# Altium footprint library Vowstar_Basic_Device.PcbLib: 170 footprints (part 9 of 11)
Each footprint in its own frame and in the unit in brackets; x right, y up, seen from the top. Pads: shape width x height; smd on the part's side, far side on the other; paste and mask are expansions set on the pad; w line width, h text height; cw(c..) or ccw(c..) is an arc to the next point about the centre after c.
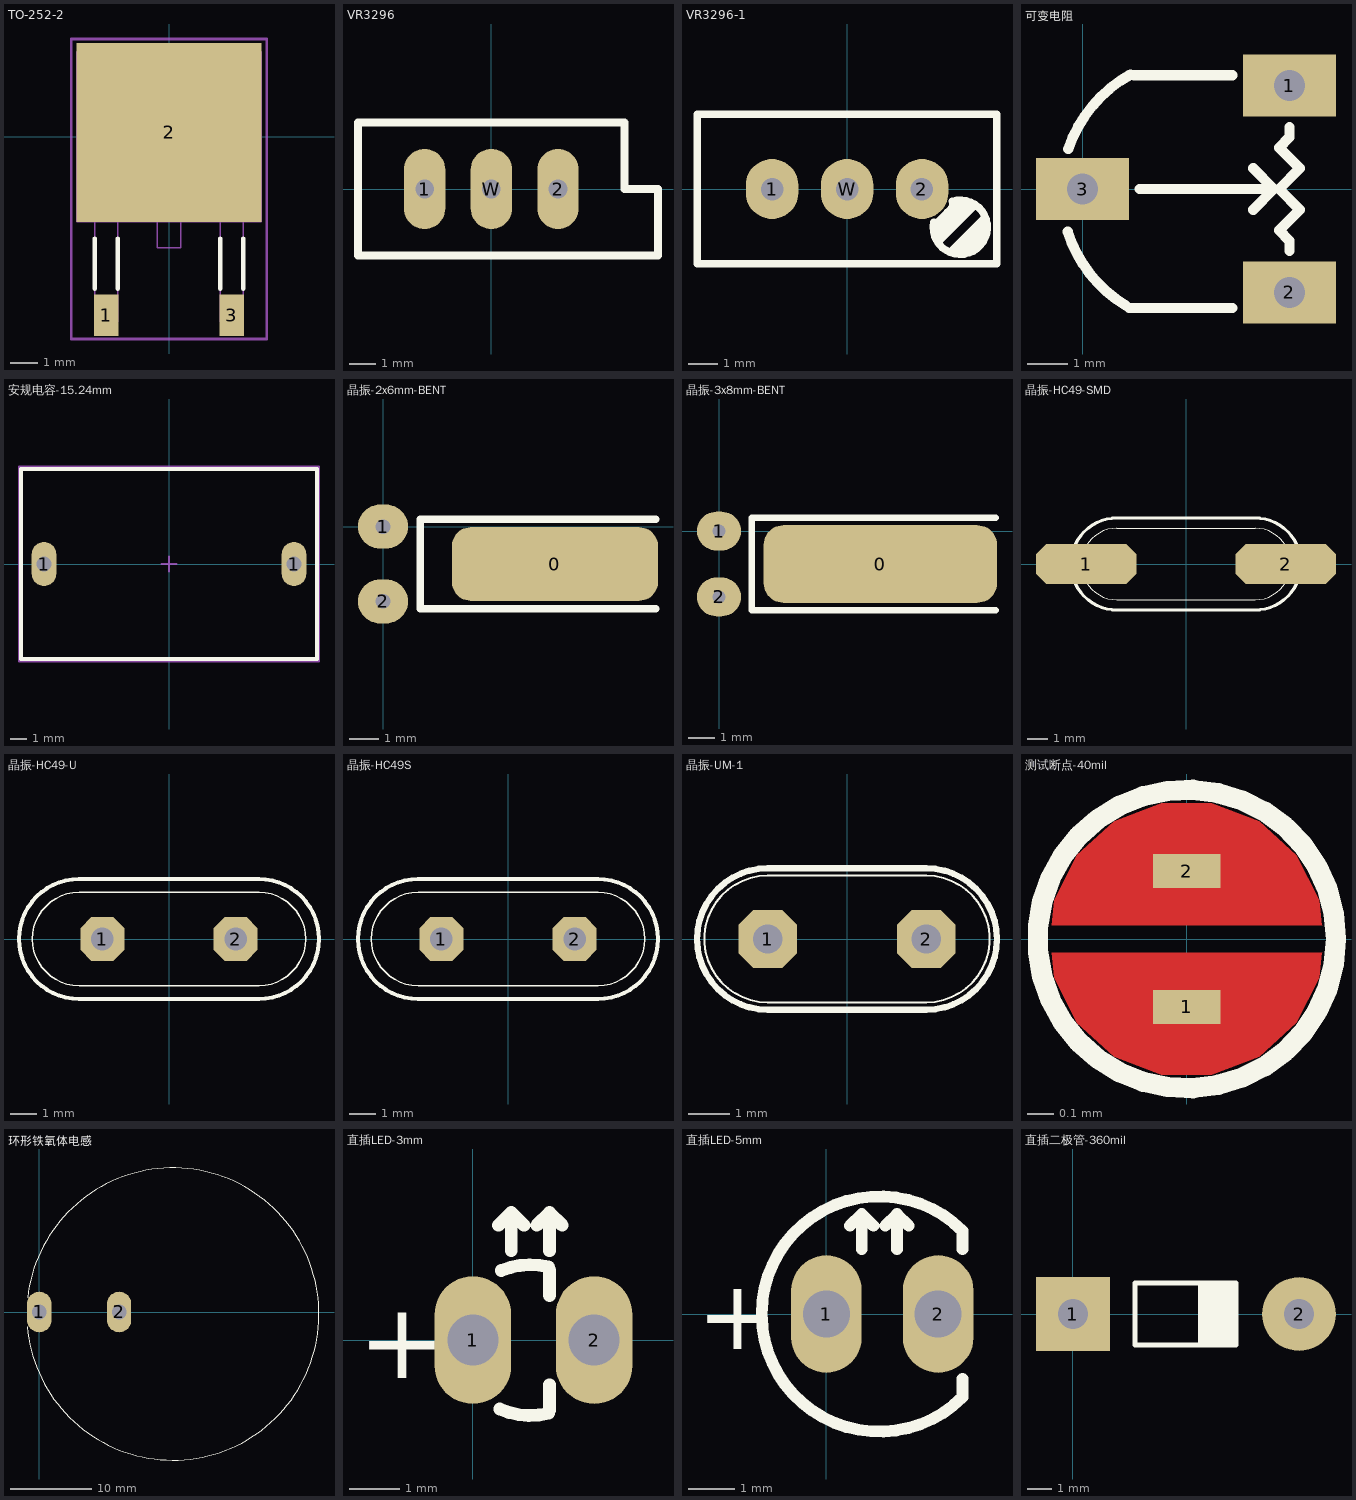
[diagram p8: the footprints below, top view; thin cyan lines are the x and y axes]

## TO-252-2 [mil] "TO-252-2,TD03B"
pads (3):
  rect 35x60 smd: 1(-89.96,-256) 3(89.96,-256)
  rect 265x256 smd: 2(0,6)
Top Overlay:
  lines w6: -106.46,-218 -106.46,-146 ; -73.46,-218 -73.46,-146 ; 73.46,-218 73.46,-146 ; 106.46,-218 106.46,-146
Mechanical 13:
  lines w2: -16.5,-122 -16.5,-159 16.5,-159 16.5,-122 ; -132.5,-122 -132.5,122 132.5,122 132.5,-122 -132.5,-122 ; -106.46,-266 -73.46,-266 -73.46,-122 -106.46,-122 -106.46,-266 ; 73.46,-266 106.46,-266 106.46,-122 73.46,-122 73.46,-266
Mechanical 15:
  lines w3.94: -19.68,0 19.68,0 ; 0,-19.68 0,19.68 ; -140,-290 140,-290 140,140 -140,140 -140,-290
3D body "User Library-TO-252AA-DPAK.step": height 93.31, standoff -1.18, extent -132.56,-270 132.56,127.64

## VR3296 [mil]
pads (3):
  oval 62x120 hole 28: 1(-100,0) 2(100,0) W(0,0)
Top Overlay:
  lines w12: -200,-100 -200,100 200,100 200,0 250,0 250,-100 -200,-100

## VR3296-1 [mil]
pads (3):
  oval 70x80 hole 30: 1(-100,0) 2(100,0) W(0,0)
Top Overlay:
  lines w10: 115.6,-44.15 ccw(c151,-51) 140.46,-16.52 ; 157.76,-74.24 164.24,-74.24 171,-81 ; 171,-21 151,-41 121,-71 121,-61 161,-21 141,-21 141,-31 ; 172.88,-79.12 171,-81 ; 181,-41 141,-81 151,-81 ; 134,-31 121,-44 121,-51 141,-31 ; 134,-31 142.5,-22.5 151,-31 141,-31 ; 134,-31 141,-31 ; 151,-81 171,-81 ; 151,-81 166.82,-65.18 172.88,-65.18 187.06,-51 187.06,-47.06 172.88,-61.23 170.77,-61.23 171,-61.47 171,-81 ; -200,-100 0,-100 200,-100 200,100 -200,100 -200,-100

## 可变电阻 [mil] "可变电阻"
height 3
pads (3):
  rect 90x60 hole 30: 1(200,100) 2(200,-100) 3(0,0)
Top Overlay:
  lines w10: -14.32,-41.37 ccw(c108.66,-2.29) 41.53,-112.49 ; -13.68,38.74 cw(c108.66,-2.29) 46.34,110.7 ; 45,-115 145,-115 ; 50,110 145,110 ; 55,0 185,0 ; 165,-20 185,0 ; 165,20 185,0 ; 200,-60 200,-50 190,-40 210,-20 190,0 210,20 190,40 200,50 200,60

## 安规电容-15.24mm [mm] "安规电容"
height 19.05
pads (2):
  oval 1.5x2.7 hole 0.9: 1(-7.62,0) 1(7.62,0)
Top Overlay:
  lines w0.254: -9.02,-5.8 -9.02,5.8 9.02,5.8 9.02,-5.8 -9.02,-5.8
Mechanical 13:
  lines w0.1: -9.017,-5.715 -9.017,5.715 9.017,5.715 9.017,-5.715 -9.017,-5.715
Mechanical 15:
  lines w0.1: -0.475,0 0.475,0 ; 0,-0.475 0,0.475 ; -9.144,-5.969 9.144,-5.969 9.144,5.969 -9.144,5.969 -9.144,-5.969
3D body: height 19.05, standoff 0, extent -9.017,-5.715 9.017,5.715

## 晶振-2x6mm-BENT [mm] "晶振-2x6mm-BENT"
height 5
pads (3):
  rrect50% 7x2.5 smd: 0(5.842,-1.27)
  oval 1.7x1.5 hole 0.5: 1(0,0) 2(0,-2.54)
Top Overlay:
  lines w0.254: 9.271,-2.794 1.27,-2.794 1.27,0.254 9.271,0.254

## 晶振-3x8mm-BENT [mm] "晶振-3x8mm-BENT"
height 5
pads (3):
  rrect50% 9x3 smd: 0(6.223,-1.27)
  oval 1.7x1.5 hole 0.5: 1(0,0) 2(0,-2.54)
Top Overlay:
  lines w0.254: 10.668,-3.048 1.27,-3.048 1.27,0.508 10.668,0.508
3D body "User Library-Crystal Radial 1_1mm BENT.STEP": height 3.73, standoff -2.15, extent -0.265,-2.82 9.904,0.28

## 晶振-HC49-SMD [mm] "Quartz Crystal  PTH HC49 SMD"
pads (2):
  oct 5x2 smd: 1(-4.953,0) 2(4.953,0)
Top Overlay:
  lines w0.051: -3.429,-1.778 cw(c-3.429,0) -3.429,1.778 3.429,1.778 cw(c3.429,0) 3.429,-1.778 -3.429,-1.778
  lines w0.152: -3.429,-2.286 cw(c-3.429,0) -3.429,2.286 3.429,2.286 cw(c3.429,0) 3.429,-2.286 -3.429,-2.286
3D body "User Library-Crystal-HC49_US-SM.step": height 4.3, standoff 0, extent -6.4,-2.415 6.4,2.415

## 晶振-HC49-U [mil] "Quartz Crystal  PTH HC49-U"
pads (2):
  oct 66x66 hole 34: 1(-100,0) 2(100,0)
Top Overlay:
  lines w2: -135,-70 cw(c-135,0) -135,70 135,70 cw(c135,0) 135,-70 -135,-70
  lines w6: -135,-90 cw(c-135,0) -135,90 135,90 cw(c135,0) 135,-90 -135,-90
3D body "User Library-Crystal-HC49U.STEP": height 530.92, standoff -77.74, extent -220,-93.06 219.86,90.9

## 晶振-HC49S [mil] "Quartz Crystal  PTH HC49S"
pads (2):
  oct 66x66 hole 34: 1(-100,0) 2(100,0)
Top Overlay:
  lines w2: -135,-70 cw(c-135,0) -135,70 135,70 cw(c135,0) 135,-70 -135,-70
  lines w6: -135,-90 cw(c-135,0) -135,90 135,90 cw(c135,0) 135,-90 -135,-90
3D body "User Library-Crystal-HC49S-1.STEP": height 141.73, standoff -118.11, extent -216.14,-88.41 216.14,88.41

## 晶振-UM-1 [mm] "Quartz Crystal  PTH UM-1"
pads (2):
  oct 1.4x1.4 hole 0.7: 1(-1.905,0) 2(1.905,0)
Top Overlay:
  lines w0.051: -1.905,-1.524 cw(c-1.905,0) -1.905,1.524 1.905,1.524 cw(c1.905,0) 1.905,-1.524 -1.905,-1.524
  lines w0.152: -1.905,-1.7 cw(c-1.905,0) -1.905,1.7 1.905,1.7 cw(c1.905,0) 1.905,-1.7 -1.905,-1.7
3D body "User Library-Crystal-UM-1_SL.STEP": height 8, standoff -2.6, extent -4,-1.6 4,1.6

## 测试断点-40mil [mil] "测试断点-40mil"
pads (2):
  rect 10x5 smd: 1(0,-10) 2(0,10)
Top Layer:
  region: 20,2 -20,2 -19.9,1.99 -19.53,5.69 -16.18,12.33 -10.66,17.32 -3.72,20 3.72,20 10.66,17.32 16.18,12.33 19.53,5.69 19.9,1.99
  region: -20,-2 20,-2 19.9,-1.99 19.53,-5.69 16.18,-12.33 10.66,-17.32 3.72,-20 -3.72,-20 -10.66,-17.32 -16.18,-12.33 -19.53,-5.69 -19.9,-1.99
Top Overlay:
  circle w3: c0,0 r22
Top Paste:
  region: 20,2 -20,2 -19.9,1.99 -19.53,5.69 -16.18,12.33 -10.66,17.32 -3.72,20 3.72,20 10.66,17.32 16.18,12.33 19.53,5.69 19.9,1.99
  region: -20,-2 20,-2 19.9,-1.99 19.53,-5.69 16.18,-12.33 10.66,-17.32 3.72,-20 -3.72,-20 -10.66,-17.32 -16.18,-12.33 -19.53,-5.69 -19.9,-1.99
Top Solder:
  region: 21.78,0 -22.22,0 -22.22,4.38 -18.87,12.46 -12.68,18.65 -4.59,22 4.16,22 12.25,18.65 18.44,12.46 21.78,4.38
  region: -22.22,0 21.78,0 21.78,-4.38 18.44,-12.46 12.25,-18.65 4.16,-22 -4.59,-22 -12.68,-18.65 -18.87,-12.46 -22.22,-4.38

## 环形铁氧体电感 [mm] "环形铁氧体电感"
height 10
pads (2):
  oval 3x5 hole 1.8 mask+0: 1(0.025,0.05) 2(9.85,0.05)
Top Overlay:
  lines w0.1: -1.458,-1.749 ccw(c16.475,-0.2) -1.414,1.794

## 直插LED-3mm [mil] "直插LED"
pads (2):
  oval 60x100 hole 40: 1(0,0) 2(95,0)
Top Overlay:
  lines w10: 20,90 30,100 ; 21.02,-53.97 ccw(c45,0) 59.32,-57.29 ; 22.29,54.51 cw(c45,0) 59.32,57.29 ; 30,70 30,100 ; 40,90 30,100 ; 50,90 60,100 ; 60,-55 60,-35 ; 60,35 60,55 ; 60,70 60,100 ; 70,90 60,100
  text "+" at -90,-30 h60

## 直插LED-5mm [mil] "直插LED"
pads (2):
  oval 60x100 hole 40: 1(0,0) 2(95,0)
Top Overlay:
  lines w10: 20,75 30,85 ; 30,55 30,85 ; 40,75 30,85 ; 50,75 60,85 ; 60,55 60,85 ; 70,75 60,85 ; 115.71,-55 115.71,-70.71 cw(c45,0) 115.71,70.71 115.71,55
  text "+" at -110,-30 h60

## 直插二极管-360mil [mm] "直插二极管-360mil"
pads (2):
  rect 3x3 hole 1.2: 1(0,0)
  round 3 hole 1.2 paste+0: 2(9.172,0)
Top Overlay:
  rectangle: 5.08,-1.25 6.722,1.25
  lines w0.2: 6.622,-1.25 2.522,-1.25 2.522,1.25 6.622,1.25